# Altium footprint library JL_PCB.PCBLIB: 1112 footprints (part 35 of 71)
Each footprint in its own frame and in the unit in brackets; x right, y up, seen from the top. Pads: shape width x height; smd on the part's side, far side on the other; paste and mask are expansions set on the pad; w line width, h text height; cw(c..) or ccw(c..) is an arc to the next point about the centre after c.
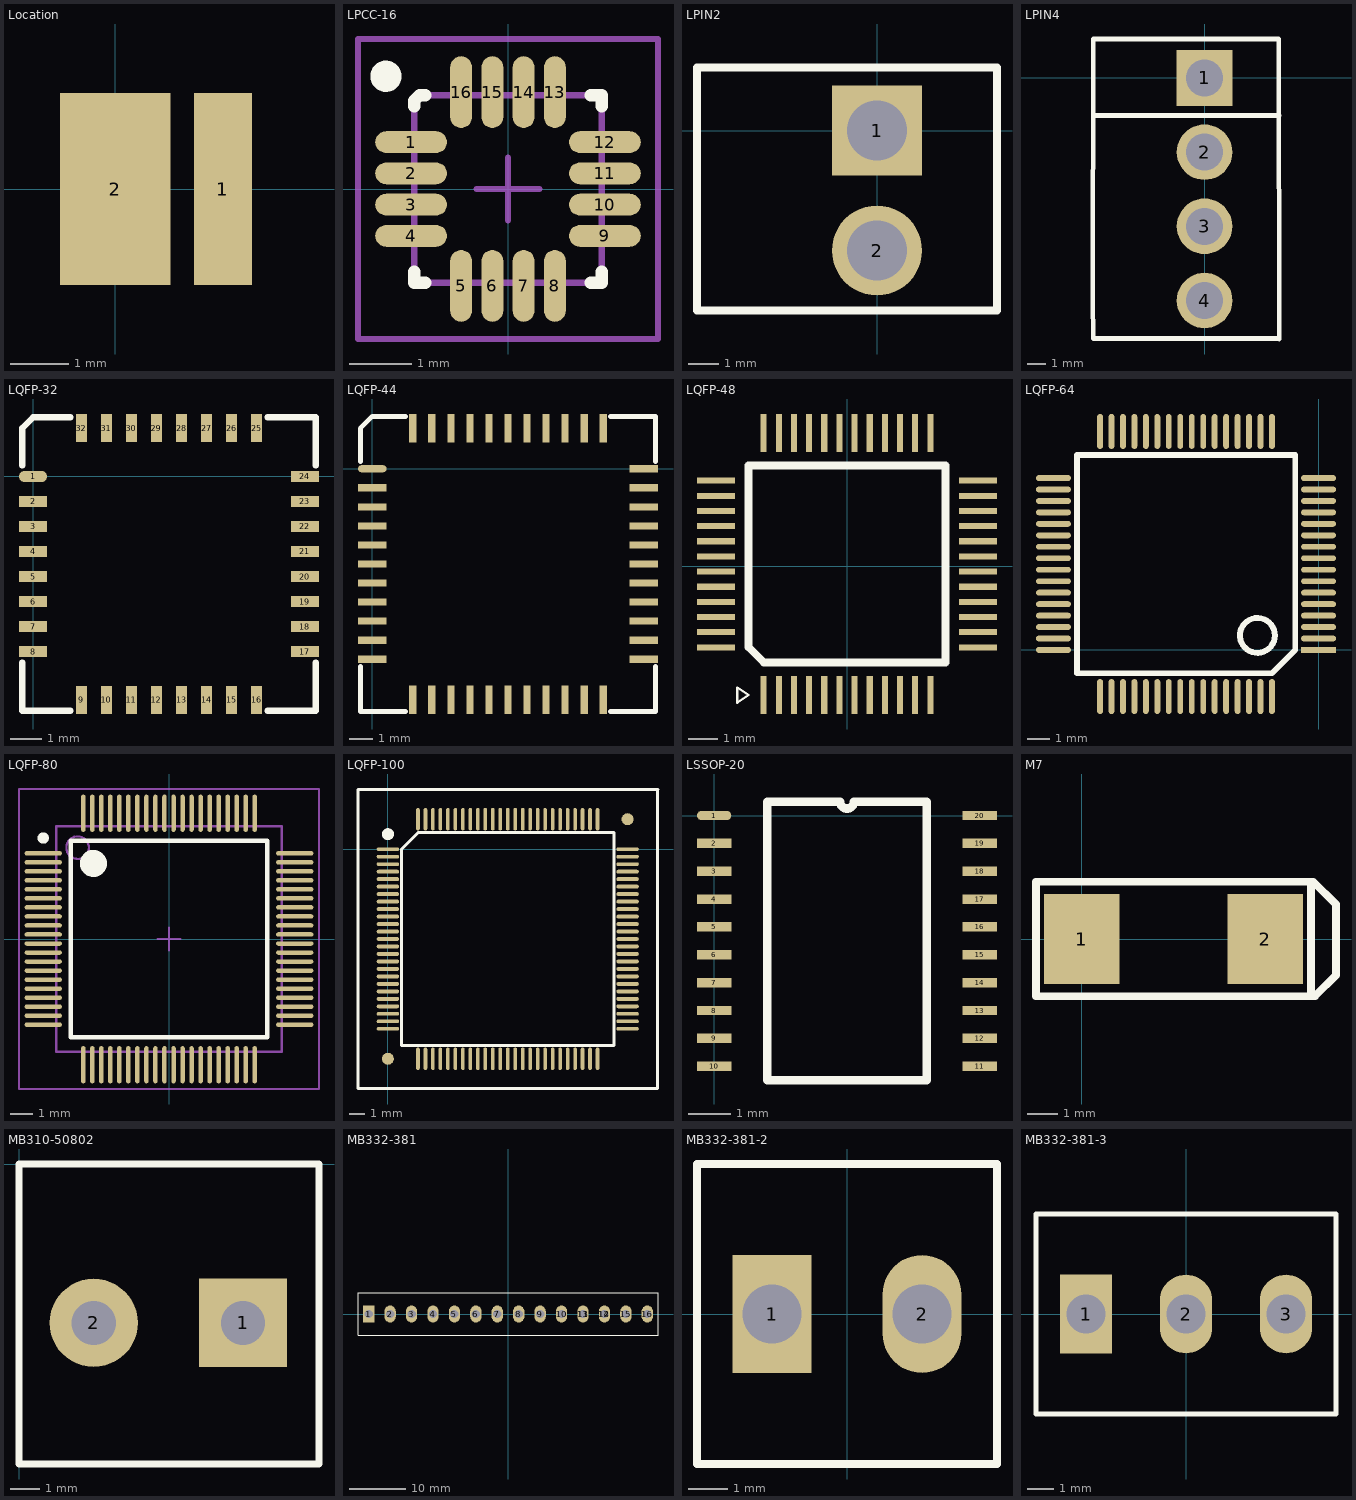
[diagram p34: the footprints below, top view; thin cyan lines are the x and y axes]

## Location [mm]
pads (2):
  rect 1x3.3 smd: 1(1.85,0)
  rect 1.9x3.3 smd: 2(0,0)

## LPCC-16 [mm] "LCC, 16-Pins, Body 3.0x3.0mm (max), Pitch 0.50mm, IPC Medium Density"
height 0.9
pads (16):
  oval 1.15x0.35 smd: 1(-1.55,0.75) 2(-1.55,0.25) 3(-1.55,-0.25) 4(-1.55,-0.75) 9(1.55,-0.75) 10(1.55,-0.25) 11(1.55,0.25) 12(1.55,0.75)
  oval 0.35x1.15 smd: 5(-0.75,-1.55) 6(-0.25,-1.55) 7(0.25,-1.55) 8(0.75,-1.55) 13(0.75,1.55) 14(0.25,1.55) 15(-0.25,1.55) 16(-0.75,1.55)
TopOverlay:
  circle w0.25: c-1.954,1.803 r0.125
  lines w0.2: -1.5,-1.325 -1.5,-1.5 -1.325,-1.5 ; -1.5,1.325 -1.5,1.412 -1.412,1.5 -1.325,1.5 ; 1.325,-1.5 1.5,-1.5 1.5,-1.325 ; 1.325,1.5 1.5,1.5 1.5,1.325
Mechanical13:
  lines w0.1: -1.5,-1.5 -1.5,1.412 -1.412,1.5 1.5,1.5 1.5,-1.5 -1.5,-1.5
Mechanical15:
  lines w0.1: -0.5,0 0.5,0 ; 0,-0.5 0,0.5 ; -2.4,-2.4 -2.4,2.4 2.4,2.4 2.4,-2.4 -2.4,-2.4
3D body: height 0.9, standoff 0, extent -1.5,-1.5 1.5,1.5

## LPIN2 [mm]
pads (2):
  rect 3x3 hole 2: 1(0,0)
  round 3 hole 2: 2(0,-4)
TopOverlay:
  lines w0.254: -6,-6 4,-6 4,2.1 -6,2.1 -6,-4 -6,-6

## LPIN4 [mm]
pads (4):
  rect 3x3 hole 2: 1(0,0)
  round 3 hole 2: 2(0,-4) 3(0,-8) 4(0,-12)
TopOverlay:
  lines w0.254: -6,-14.05 4,-14.05 ; -6,-14.025 -6.025,-11.95 -6,2.1 4,2.1 4.025,-14.075 ; -5.975,-2.025 4.025,-2.025

## LQFP-32 [mm]
pads (32):
  oval 0.9x0.35 smd: 1(0,0)
  rect 0.9x0.35 smd: 2(0,-0.8) 3(0,-1.6) 4(0,-2.4) 5(0,-3.2) 6(0,-4) 7(0,-4.8) 8(0,-5.6) 17(8.7,-5.6) 18(8.7,-4.8) 19(8.7,-4) 20(8.7,-3.2) 21(8.7,-2.4) 22(8.7,-1.6) 23(8.7,-0.8) 24(8.7,0)
  rect 0.35x0.9 smd: 9(1.55,-7.15) 10(2.35,-7.15) 11(3.15,-7.15) 12(3.95,-7.15) 13(4.75,-7.15) 14(5.55,-7.15) 15(6.35,-7.15) 16(7.15,-7.15) 25(7.15,1.55) 26(6.35,1.55) 27(5.55,1.55) 28(4.75,1.55) 29(3.95,1.55) 30(3.15,1.55) 31(2.35,1.55) 32(1.55,1.55)
TopOverlay:
  lines w0.2: -0.35,-5.95 -0.35,-7.5 1.2,-7.5 ; -0.35,0.35 -0.35,1.55 0,1.9 1.2,1.9 ; 7.5,-7.5 9.05,-7.5 9.05,-5.95 ; 7.5,1.9 9.05,1.9 9.05,0.35

## LQFP-44 [mm]
pads (44):
  oval 1.2x0.3 smd: 1(0,0)
  rect 1.2x0.3 smd: 2(0,-0.8) 3(0,-1.6) 4(0,-2.4) 5(0,-3.2) 6(0,-4) 7(0,-4.8) 8(0,-5.6) 9(0,-6.4) 10(0,-7.2) 11(0,-8) 23(11.4,-8) 24(11.4,-7.2) 25(11.4,-6.4) 26(11.4,-5.6) 27(11.4,-4.8) 28(11.4,-4) 29(11.4,-3.2) 30(11.4,-2.4) 31(11.4,-1.6) 32(11.4,-0.8) 33(11.4,0)
  rect 0.3x1.2 smd: 12(1.7,-9.7) 13(2.5,-9.7) 14(3.3,-9.7) 15(4.1,-9.7) 16(4.9,-9.7) 17(5.7,-9.7) 18(6.5,-9.7) 19(7.3,-9.7) 20(8.1,-9.7) 21(8.9,-9.7) 22(9.7,-9.7) 34(9.7,1.7) 35(8.9,1.7) 36(8.1,1.7) 37(7.3,1.7) 38(6.5,1.7) 39(5.7,1.7) 40(4.9,1.7) 41(4.1,1.7) 42(3.3,1.7) 43(2.5,1.7) 44(1.7,1.7)
TopOverlay:
  lines w0.2: -0.5,-8.3 -0.5,-10.2 1.4,-10.2 ; -0.5,0.3 -0.5,1.7 0,2.2 1.4,2.2 ; 10,-10.2 11.9,-10.2 11.9,-8.3 ; 10,2.2 11.9,2.2 11.9,0.3

## LQFP-48 [mil]
pads (48):
  rect 8x50 smd: 1(-110,-170) 2(-90,-170) 3(-70,-170) 4(-50,-170) 5(-30,-170) 6(-10,-170) 7(10,-170) 8(30,-170) 9(50,-170) 10(70,-170) 11(90,-170) 12(110,-170) 25(110,176) 26(90,176) 27(70,176) 28(50,176) 29(30,176) 30(10,176) 31(-10,176) 32(-30,176) 33(-50,176) 34(-70,176) 35(-90,176) 36(-110,176)
  rect 50x8 smd: 13(173,-107) 14(173,-87) 15(173,-67) 16(173,-47) 17(173,-27) 18(173,-7) 19(173,13) 20(173,33) 21(173,53) 22(173,73) 23(173,93) 24(173,113) 37(-173,113) 38(-173,93) 39(-173,73) 40(-173,53) 41(-173,33) 42(-173,13) 43(-173,-7) 44(-173,-27) 45(-173,-47) 46(-173,-67) 47(-173,-87) 48(-173,-107)
TopOverlay:
  lines w3: -145,-180 -130,-170 -145,-160 -145,-180
  lines w10: -130,-107 -130,133 130,133 130,-127 -110,-127 -130,-107

## LQFP-64 [mil]
pads (64):
  rect 60x10 smd: 1(0,0)
  oval 60x10 smd: 2(0,19.68) 3(0,39.37) 4(0,59.05) 5(0,78.74) 6(0,98.42) 7(0,118.11) 8(0,137.79) 9(0,157.48) 10(0,177.16) 11(0,196.85) 12(0,216.53) 13(0,236.22) 14(0,255.91) 15(0,275.59) 16(0,295.27) 33(-455.27,295.27) 34(-455.27,275.59) 35(-455.27,255.91) 36(-455.27,236.22) 37(-455.27,216.53) 38(-455.27,196.85) 39(-455.27,177.16) 40(-455.27,157.48) 41(-455.27,137.79) 42(-455.27,118.11) 43(-455.27,98.42) 44(-455.27,78.74) 45(-455.27,59.05) 46(-455.27,39.37) 47(-455.27,19.68) 48(-455.27,0)
  oval 10x60 smd: 17(-80,375.27) 18(-99.69,375.27) 19(-119.37,375.27) 20(-139.06,375.27) 21(-158.74,375.27) 22(-178.43,375.27) 23(-198.11,375.27) 24(-217.79,375.27) 25(-237.48,375.27) 26(-257.17,375.27) 27(-276.85,375.27) 28(-296.54,375.27) 29(-316.22,375.27) 30(-335.9,375.27) 31(-355.59,375.27) 32(-375.27,375.27) 49(-375.27,-80) 50(-355.59,-80) 51(-335.9,-80) 52(-316.22,-80) 53(-296.54,-80) 54(-276.85,-80) 55(-257.17,-80) 56(-237.48,-80) 57(-217.79,-80) 58(-198.11,-80) 59(-178.43,-80) 60(-158.74,-80) 61(-139.06,-80) 62(-119.37,-80) 63(-99.69,-80) 64(-80,-80)
TopOverlay:
  circle w10: c-105,25 r30
  lines w10: -415,-40 -80,-40 -40,0 -40,335 -415,335 -415,-40

## LQFP-80 [mm] "TSQFP, 80-Leads, Body 12.0x12.0mm (max), Pitch 0.40mm, IPC Medium Density"
height 1.6
pads (80):
  oval 1.65x0.2 smd: 1(-5.575,3.8) 2(-5.575,3.4) 3(-5.575,3) 4(-5.575,2.6) 5(-5.575,2.2) 6(-5.575,1.8) 7(-5.575,1.4) 8(-5.575,1) 9(-5.575,0.6) 10(-5.575,0.2) 11(-5.575,-0.2) 12(-5.575,-0.6) 13(-5.575,-1) 14(-5.575,-1.4) 15(-5.575,-1.8) 16(-5.575,-2.2) 17(-5.575,-2.6) 18(-5.575,-3) 19(-5.575,-3.4) 20(-5.575,-3.8) 41(5.575,-3.8) 42(5.575,-3.4) 43(5.575,-3) 44(5.575,-2.6) 45(5.575,-2.2) 46(5.575,-1.8) 47(5.575,-1.4) 48(5.575,-1) 49(5.575,-0.6) 50(5.575,-0.2) 51(5.575,0.2) 52(5.575,0.6) 53(5.575,1) 54(5.575,1.4) 55(5.575,1.8) 56(5.575,2.2) 57(5.575,2.6) 58(5.575,3) 59(5.575,3.4) 60(5.575,3.8)
  oval 0.2x1.65 smd: 21(-3.8,-5.575) 22(-3.4,-5.575) 23(-3,-5.575) 24(-2.6,-5.575) 25(-2.2,-5.575) 26(-1.8,-5.575) 27(-1.4,-5.575) 28(-1,-5.575) 29(-0.6,-5.575) 30(-0.2,-5.575) 31(0.2,-5.575) 32(0.6,-5.575) 33(1,-5.575) 34(1.4,-5.575) 35(1.8,-5.575) 36(2.2,-5.575) 37(2.6,-5.575) 38(3,-5.575) 39(3.4,-5.575) 40(3.8,-5.575) 61(3.8,5.575) 62(3.4,5.575) 63(3,5.575) 64(2.6,5.575) 65(2.2,5.575) 66(1.8,5.575) 67(1.4,5.575) 68(1,5.575) 69(0.6,5.575) 70(0.2,5.575) 71(-0.2,5.575) 72(-0.6,5.575) 73(-1,5.575) 74(-1.4,5.575) 75(-1.8,5.575) 76(-2.2,5.575) 77(-2.6,5.575) 78(-3,5.575) 79(-3.4,5.575) 80(-3.8,5.575)
TopOverlay:
  circle w0.6: c-3.35,3.35 r0.3
  circle w0.25: c-5.575,4.475 r0.125
  lines w0.2: -4.35,-4.35 4.35,-4.35 4.35,4.35 -4.35,4.35 -4.35,-4.35
Mechanical13:
  circle w0.1: c-4.05,4.05 r0.5
  lines w0.1: -5,-5 5,-5 5,5 -5,5 -5,-5
Mechanical15:
  lines w0.1: -0.5,0 0.5,0 ; 0,-0.5 0,0.5 ; -6.65,-6.65 6.65,-6.65 6.65,6.65 -6.65,6.65 -6.65,-6.65
3D body: height 1.6, standoff 0.15, extent -5,-5 5,5

## LQFP-100 [mm]
pads (102):
  oval 1.5x0.25 smd: 1(0,0) 2(0,-0.5) 3(0,-1) 4(0,-1.5) 5(0,-2) 6(0,-2.5) 7(0,-3) 8(0,-3.5) 9(0,-4) 10(0,-4.5) 11(0,-5) 12(0,-5.5) 13(0,-6) 14(0,-6.5) 15(0,-7) 16(0,-7.5) 17(0,-8) 18(0,-8.5) 19(0,-9) 20(0,-9.5) 21(0,-10) 22(0,-10.5) 23(0,-11) 24(0,-11.5) 25(0,-12) 51(16,-12) 52(16,-11.5) 53(16,-11) 54(16,-10.5) 55(16,-10) 56(16,-9.5) 57(16,-9) 58(16,-8.5) 59(16,-8) 60(16,-7.5) 61(16,-7) 62(16,-6.5) 63(16,-6) 64(16,-5.5) 65(16,-5) 66(16,-4.5) 67(16,-4) 68(16,-3.5) 69(16,-3) 70(16,-2.5) 71(16,-2) 72(16,-1.5) 73(16,-1) 74(16,-0.5) 75(16,0)
  oval 0.25x1.5 smd: 26(2,-14) 27(2.5,-14) 28(3,-14) 29(3.5,-14) 30(4,-14) 31(4.5,-14) 32(5,-14) 33(5.5,-14) 34(6,-14) 35(6.5,-14) 36(7,-14) 37(7.5,-14) 38(8,-14) 39(8.5,-14) 40(9,-14) 41(9.5,-14) 42(10,-14) 43(10.5,-14) 44(11,-14) 45(11.5,-14) 46(12,-14) 47(12.5,-14) 48(13,-14) 49(13.5,-14) 50(14,-14) 76(14,2) 77(13.5,2) 78(13,2) 79(12.5,2) 80(12,2) 81(11.5,2) 82(11,2) 83(10.5,2) 84(10,2) 85(9.5,2) 86(9,2) 87(8.5,2) 88(8,2) 89(7.5,2) 90(7,2) 91(6.5,2) 92(6,2) 93(5.5,2) 94(5,2) 95(4.5,2) 96(4,2) 97(3.5,2) 98(3,2) 99(2.5,2) 100(2,2)
  round 0.8 smd: ""(0,-14) ""(16,2)
TopOverlay:
  circle w0.4: c0,1 r0.2
  lines w0.2: 18,4 18,-16 -2,-16 -2,4 18.034,4 ; 0.9,-13.1 0.9,0 2,1.1 15.1,1.1 15.1,-13.1 0.9,-13.1

## LSSOP-20 [mm]
pads (20):
  oval 0.8x0.22 smd: 1(0,0)
  rect 0.8x0.22 smd: 2(0,-0.65) 3(0,-1.3) 4(0,-1.95) 5(0,-2.6) 6(0,-3.25) 7(0,-3.9) 8(0,-4.55) 9(0,-5.2) 10(0,-5.85) 11(6.2,-5.85) 12(6.2,-5.2) 13(6.2,-4.55) 14(6.2,-3.9) 15(6.2,-3.25) 16(6.2,-2.6) 17(6.2,-1.95) 18(6.2,-1.3) 19(6.2,-0.65) 20(6.2,0)
TopOverlay:
  lines w0.2: 1.235,-6.175 1.235,0.325 2.937,0.325 ccw(c3.1,0.325) 3.262,0.325 4.965,0.325 4.965,-6.175 1.235,-6.175

## M7 [mm]
pads (2):
  rect 2.5x3 smd: 1(0,0) 2(6.096,0)
TopOverlay:
  lines w0.254: 7.574,-1.905 7.75,-1.905 8.45,-1.205 8.45,1.15 7.695,1.905 7.574,1.905 ; -1.524,-1.905 7.62,-1.905 7.62,1.905 -1.524,1.905 -1.524,-1.905

## MB310-50802 [mm]
height 14
pads (2):
  rect 3x3 hole 1.5: 1(7.62,-5.4)
  round 3 hole 1.5: 2(2.54,-5.4)
TopOverlay:
  lines w0.254: 0,-10.2 0,0 10.2,0 10.2,-10.2 0,-10.2

## MB332-381 [mm]
pads (16):
  rect 2x3 hole 1.5: 1(-24.765,0)
  oval 2x3 hole 1.5: 2(-20.955,0) 3(-17.145,0) 4(-13.335,0) 5(-9.525,0) 6(-5.715,0) 7(-1.905,0) 8(1.905,0) 9(5.715,0) 10(9.525,0) 11(13.335,0) 12(17.145,0) 13(13.335,0) 14(17.145,0) 15(20.955,0) 16(24.765,0)
TopOverlay:
  lines w0.2: -26.67,-3.81 -26.67,3.81 26.67,3.81 26.67,-3.81 -26.67,-3.81

## MB332-381-2 [mm]
pads (2):
  rect 2x3 hole 1.5: 1(-1.905,0)
  oval 2x3 hole 1.5: 2(1.905,0)
TopOverlay:
  lines w0.2: -3.81,-3.81 -3.81,3.81 3.81,3.81 3.81,-3.81 -3.81,-3.81

## MB332-381-3 [mm]
pads (3):
  rect 2x3 hole 1.5: 1(-3.81,0)
  oval 2x3 hole 1.5: 2(0,0) 3(3.81,0)
TopOverlay:
  lines w0.2: -5.715,-3.81 -5.715,3.81 5.715,3.81 5.715,-3.81 -5.715,-3.81